# Altium footprint library Connector_Samtec_HLE_SMD.PcbLib: 290 footprints (part 18 of 24)
Each footprint in its own frame and in the unit in brackets; x right, y up, seen from the top. Pads: shape width x height; smd on the part's side, far side on the other; paste and mask are expansions set on the pad; w line width, h text height; cw(c..) or ccw(c..) is an arc to the next point about the centre after c.
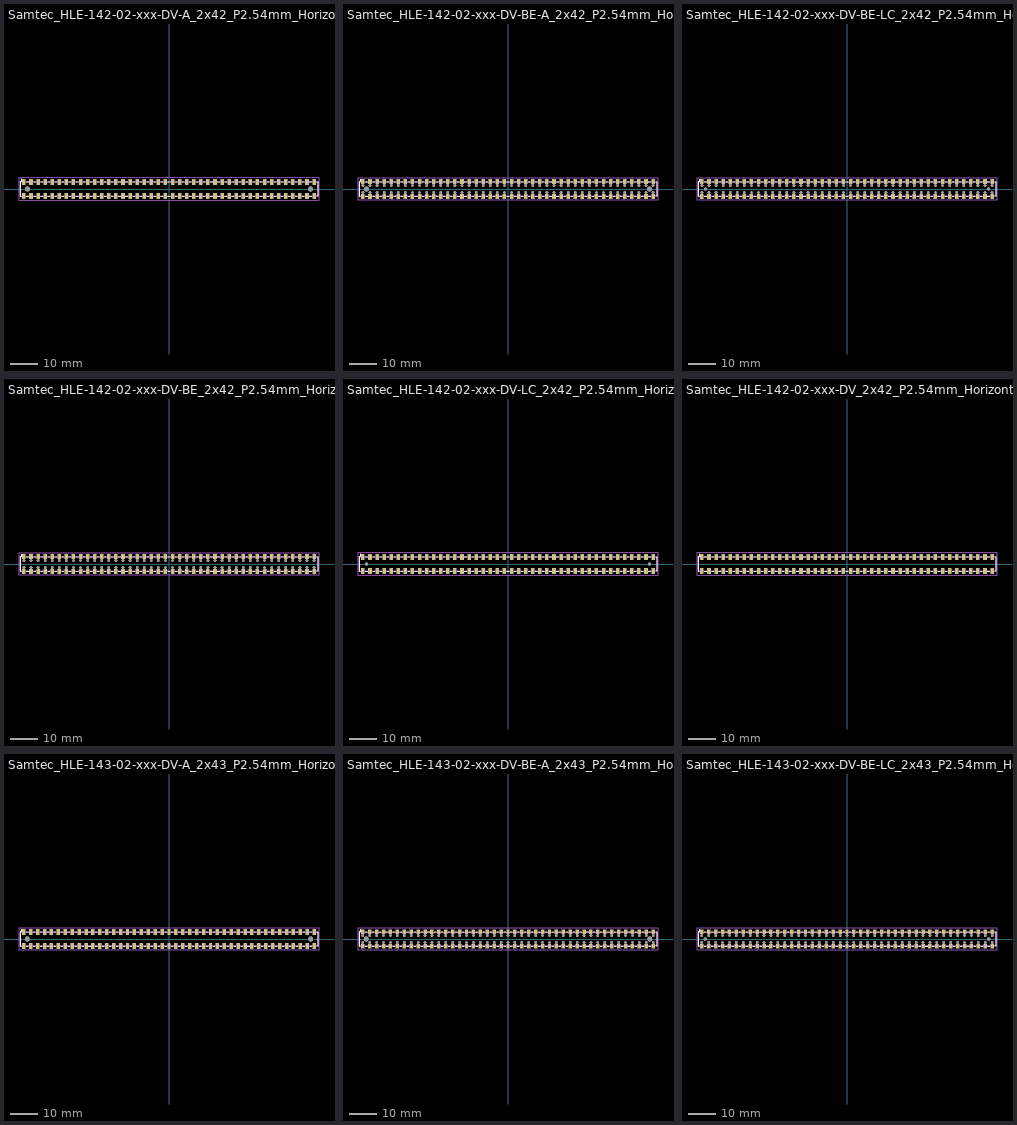
[diagram p17: the footprints below, top view; thin cyan lines are the x and y axes]

## Samtec_HLE-142-02-xxx-DV-A_2x42_P2.54mm_Horizontal [mm]
pads (86):
  rect 1.27x2.29 smd: 1(-52.07,2.525) 2(-52.07,-2.525) 3(-49.53,2.525) 4(-49.53,-2.525) 5(-46.99,2.525) 6(-46.99,-2.525) 7(-44.45,2.525) 8(-44.45,-2.525) 9(-41.91,2.525) 10(-41.91,-2.525) 11(-39.37,2.525) 12(-39.37,-2.525) 13(-36.83,2.525) 14(-36.83,-2.525) 15(-34.29,2.525) 16(-34.29,-2.525) 17(-31.75,2.525) 18(-31.75,-2.525) 19(-29.21,2.525) 20(-29.21,-2.525) 21(-26.67,2.525) 22(-26.67,-2.525) 23(-24.13,2.525) 24(-24.13,-2.525) 25(-21.59,2.525) 26(-21.59,-2.525) 27(-19.05,2.525) 28(-19.05,-2.525) 29(-16.51,2.525) 30(-16.51,-2.525) 31(-13.97,2.525) 32(-13.97,-2.525) 33(-11.43,2.525) 34(-11.43,-2.525) 35(-8.89,2.525) 36(-8.89,-2.525) 37(-6.35,2.525) 38(-6.35,-2.525) 39(-3.81,2.525) 40(-3.81,-2.525) 41(-1.27,2.525) 42(-1.27,-2.525) 43(1.27,2.525) 44(1.27,-2.525) 45(3.81,2.525) 46(3.81,-2.525) 47(6.35,2.525) 48(6.35,-2.525) 49(8.89,2.525) 50(8.89,-2.525) 51(11.43,2.525) 52(11.43,-2.525) 53(13.97,2.525) 54(13.97,-2.525) 55(16.51,2.525) 56(16.51,-2.525) 57(19.05,2.525) 58(19.05,-2.525) 59(21.59,2.525) 60(21.59,-2.525) 61(24.13,2.525) 62(24.13,-2.525) 63(26.67,2.525) 64(26.67,-2.525) 65(29.21,2.525) 66(29.21,-2.525) 67(31.75,2.525) 68(31.75,-2.525) 69(34.29,2.525) 70(34.29,-2.525) 71(36.83,2.525) 72(36.83,-2.525) 73(39.37,2.525) 74(39.37,-2.525) 75(41.91,2.525) 76(41.91,-2.525) 77(44.45,2.525) 78(44.45,-2.525) 79(46.99,2.525) 80(46.99,-2.525) 81(49.53,2.525) 82(49.53,-2.525) 83(52.07,2.525) 84(52.07,-2.525)
  round 1.78 hole 1.78: Un1(-50.8,0) Un2(50.8,0)
F.SilkS:
  lines w0.12: -52.965,-2.65 -53.45,-2.65 -53.45,2.65 -52.965,2.65 -52.965,3.67 ; -51.175,-2.65 -50.425,-2.65 ; -51.175,2.65 -50.425,2.65 ; -48.635,-2.65 -47.885,-2.65 ; -48.635,2.65 -47.885,2.65 ; -46.095,-2.65 -45.345,-2.65 ; -46.095,2.65 -45.345,2.65 ; -43.555,-2.65 -42.805,-2.65 ; -43.555,2.65 -42.805,2.65 ; -41.015,-2.65 -40.265,-2.65 ; -41.015,2.65 -40.265,2.65 ; -38.475,-2.65 -37.725,-2.65 ; -38.475,2.65 -37.725,2.65 ; -35.935,-2.65 -35.185,-2.65 ; -35.935,2.65 -35.185,2.65 ; -33.395,-2.65 -32.645,-2.65 ; -33.395,2.65 -32.645,2.65 ; -30.855,-2.65 -30.105,-2.65 ; -30.855,2.65 -30.105,2.65 ; -28.315,-2.65 -27.565,-2.65 ; -28.315,2.65 -27.565,2.65 ; -25.775,-2.65 -25.025,-2.65 ; -25.775,2.65 -25.025,2.65 ; -23.235,-2.65 -22.485,-2.65 ; -23.235,2.65 -22.485,2.65 ; -20.695,-2.65 -19.945,-2.65 ; -20.695,2.65 -19.945,2.65 ; -18.155,-2.65 -17.405,-2.65 ; -18.155,2.65 -17.405,2.65 ; -15.615,-2.65 -14.865,-2.65 ; -15.615,2.65 -14.865,2.65 ; -13.075,-2.65 -12.325,-2.65 ; -13.075,2.65 -12.325,2.65 ; -10.535,-2.65 -9.785,-2.65 ; -10.535,2.65 -9.785,2.65 ; -7.995,-2.65 -7.245,-2.65 ; -7.995,2.65 -7.245,2.65 ; -5.455,-2.65 -4.705,-2.65 ; -5.455,2.65 -4.705,2.65 ; -2.915,-2.65 -2.165,-2.65 ; -2.915,2.65 -2.165,2.65 ; -0.375,-2.65 0.375,-2.65 ; -0.375,2.65 0.375,2.65 ; 2.165,-2.65 2.915,-2.65 ; 2.165,2.65 2.915,2.65 ; 4.705,-2.65 5.455,-2.65 ; 4.705,2.65 5.455,2.65 ; 7.245,-2.65 7.995,-2.65 ; 7.245,2.65 7.995,2.65 ; 9.785,-2.65 10.535,-2.65 ; 9.785,2.65 10.535,2.65 ; 12.325,-2.65 13.075,-2.65 ; 12.325,2.65 13.075,2.65 ; 14.865,-2.65 15.615,-2.65 ; 14.865,2.65 15.615,2.65 ; 17.405,-2.65 18.155,-2.65 ; 17.405,2.65 18.155,2.65 ; 19.945,-2.65 20.695,-2.65 ; 19.945,2.65 20.695,2.65 ; 22.485,-2.65 23.235,-2.65 ; 22.485,2.65 23.235,2.65 ; 25.025,-2.65 25.775,-2.65 ; 25.025,2.65 25.775,2.65 ; 27.565,-2.65 28.315,-2.65 ; 27.565,2.65 28.315,2.65 ; 30.105,-2.65 30.855,-2.65 ; 30.105,2.65 30.855,2.65 ; 32.645,-2.65 33.395,-2.65 ; 32.645,2.65 33.395,2.65 ; 35.185,-2.65 35.935,-2.65 ; 35.185,2.65 35.935,2.65 ; 37.725,-2.65 38.475,-2.65 ; 37.725,2.65 38.475,2.65 ; 40.265,-2.65 41.015,-2.65 ; 40.265,2.65 41.015,2.65 ; 42.805,-2.65 43.555,-2.65 ; 42.805,2.65 43.555,2.65 ; 45.345,-2.65 46.095,-2.65 ; 45.345,2.65 46.095,2.65 ; 47.885,-2.65 48.635,-2.65 ; 47.885,2.65 48.635,2.65 ; 50.425,-2.65 51.175,-2.65 ; 50.425,2.65 51.175,2.65 ; 52.965,-2.65 53.45,-2.65 53.45,2.65 52.965,2.65
F.CrtYd:
  lines w0.05: -53.84,-4.17 -53.84,4.17 53.84,4.17 53.84,-4.17 -53.84,-4.17
F.Fab:
  lines w0.1: -52.57,2.54 -52.07,1.833 -51.57,2.54 ; -53.34,-2.54 53.34,-2.54 53.34,2.54 -53.34,2.54 -53.34,-2.54
  text "'.Designator'" at -4.047,-2.68 h1

## Samtec_HLE-142-02-xxx-DV-BE-A_2x42_P2.54mm_Horizontal [mm]
pads (170):
  rect 1.27x1.68 smd: 1(-52.07,2.72) 2(-52.07,-2.72) 3(-49.53,2.72) 4(-49.53,-2.72) 5(-46.99,2.72) 6(-46.99,-2.72) 7(-44.45,2.72) 8(-44.45,-2.72) 9(-41.91,2.72) 10(-41.91,-2.72) 11(-39.37,2.72) 12(-39.37,-2.72) 13(-36.83,2.72) 14(-36.83,-2.72) 15(-34.29,2.72) 16(-34.29,-2.72) 17(-31.75,2.72) 18(-31.75,-2.72) 19(-29.21,2.72) 20(-29.21,-2.72) 21(-26.67,2.72) 22(-26.67,-2.72) 23(-24.13,2.72) 24(-24.13,-2.72) 25(-21.59,2.72) 26(-21.59,-2.72) 27(-19.05,2.72) 28(-19.05,-2.72) 29(-16.51,2.72) 30(-16.51,-2.72) 31(-13.97,2.72) 32(-13.97,-2.72) 33(-11.43,2.72) 34(-11.43,-2.72) 35(-8.89,2.72) 36(-8.89,-2.72) 37(-6.35,2.72) 38(-6.35,-2.72) 39(-3.81,2.72) 40(-3.81,-2.72) 41(-1.27,2.72) 42(-1.27,-2.72) 43(1.27,2.72) 44(1.27,-2.72) 45(3.81,2.72) 46(3.81,-2.72) 47(6.35,2.72) 48(6.35,-2.72) 49(8.89,2.72) 50(8.89,-2.72) 51(11.43,2.72) 52(11.43,-2.72) 53(13.97,2.72) 54(13.97,-2.72) 55(16.51,2.72) 56(16.51,-2.72) 57(19.05,2.72) 58(19.05,-2.72) 59(21.59,2.72) 60(21.59,-2.72) 61(24.13,2.72) 62(24.13,-2.72) 63(26.67,2.72) 64(26.67,-2.72) 65(29.21,2.72) 66(29.21,-2.72) 67(31.75,2.72) 68(31.75,-2.72) 69(34.29,2.72) 70(34.29,-2.72) 71(36.83,2.72) 72(36.83,-2.72) 73(39.37,2.72) 74(39.37,-2.72) 75(41.91,2.72) 76(41.91,-2.72) 77(44.45,2.72) 78(44.45,-2.72) 79(46.99,2.72) 80(46.99,-2.72) 81(49.53,2.72) 82(49.53,-2.72) 83(52.07,2.72) 84(52.07,-2.72)
  round 0.97 hole 0.97: Un1(-52.07,-1.27) Un2(36.83,-1.27) Un4(-3.81,1.27) Un5(-3.81,-1.27) Un6(-6.35,-1.27) Un7(36.83,1.27) Un8(29.21,1.27) Un9(-11.43,1.27) Un10(-44.45,-1.27) Un11(13.97,-1.27) Un12(26.67,1.27) Un13(41.91,-1.27) Un14(11.43,-1.27) Un15(-34.29,1.27) Un16(-24.13,-1.27) Un17(-49.53,1.27) Un18(31.75,1.27) Un19(-34.29,-1.27) Un20(-13.97,-1.27) Un21(-41.91,1.27) Un22(21.59,1.27) Un23(39.37,-1.27) Un24(1.27,-1.27) Un25(-31.75,-1.27) Un26(-49.53,-1.27) Un27(-26.67,1.27) Un28(-13.97,1.27) Un29(8.89,-1.27) Un30(-29.21,-1.27) Un31(-24.13,1.27) Un32(44.45,-1.27) Un33(-46.99,-1.27) Un35(44.45,1.27) Un36(6.35,1.27) Un37(34.29,1.27) Un38(-44.45,1.27) Un39(31.75,-1.27) Un40(6.35,-1.27) Un41(46.99,1.27) Un42(8.89,1.27) Un43(24.13,-1.27) Un44(11.43,1.27) Un45(52.07,1.27) Un46(-1.27,1.27) Un47(-39.37,-1.27) Un48(39.37,1.27) Un49(-19.05,-1.27) Un50(-39.37,1.27) Un51(-26.67,-1.27) Un52(-21.59,1.27) Un53(3.81,1.27) Un54(3.81,-1.27) Un55(52.07,-1.27) Un56(41.91,1.27) Un57(-31.75,1.27) Un58(26.67,-1.27) Un59(-46.99,1.27) Un60(46.99,-1.27) Un61(19.05,1.27) Un62(-19.05,1.27) Un63(24.13,1.27) Un64(-1.27,-1.27) Un65(49.53,-1.27) Un66(-6.35,1.27) Un67(-52.07,1.27) Un68(49.53,1.27) Un69(34.29,-1.27) Un70(-11.43,-1.27) Un71(16.51,-1.27) Un72(-8.89,1.27) Un73(-36.83,1.27) Un74(29.21,-1.27) Un75(-36.83,-1.27) Un76(-29.21,1.27) Un77(13.97,1.27) Un78(16.51,1.27) Un79(19.05,-1.27) Un80(-8.89,-1.27) Un81(21.59,-1.27) Un82(-16.51,1.27) Un83(1.27,1.27) Un84(-21.59,-1.27) Un85(-41.91,-1.27) Un86(-16.51,-1.27)
  round 1.78 hole 1.78: Un3(50.8,0) Un34(-50.8,0)
F.SilkS:
  lines w0.12: -52.965,-2.65 -53.45,-2.65 -53.45,2.65 -52.965,2.65 -52.965,3.56 ; -51.175,-2.65 -50.425,-2.65 ; -51.175,2.65 -50.425,2.65 ; -48.635,-2.65 -47.885,-2.65 ; -48.635,2.65 -47.885,2.65 ; -46.095,-2.65 -45.345,-2.65 ; -46.095,2.65 -45.345,2.65 ; -43.555,-2.65 -42.805,-2.65 ; -43.555,2.65 -42.805,2.65 ; -41.015,-2.65 -40.265,-2.65 ; -41.015,2.65 -40.265,2.65 ; -38.475,-2.65 -37.725,-2.65 ; -38.475,2.65 -37.725,2.65 ; -35.935,-2.65 -35.185,-2.65 ; -35.935,2.65 -35.185,2.65 ; -33.395,-2.65 -32.645,-2.65 ; -33.395,2.65 -32.645,2.65 ; -30.855,-2.65 -30.105,-2.65 ; -30.855,2.65 -30.105,2.65 ; -28.315,-2.65 -27.565,-2.65 ; -28.315,2.65 -27.565,2.65 ; -25.775,-2.65 -25.025,-2.65 ; -25.775,2.65 -25.025,2.65 ; -23.235,-2.65 -22.485,-2.65 ; -23.235,2.65 -22.485,2.65 ; -20.695,-2.65 -19.945,-2.65 ; -20.695,2.65 -19.945,2.65 ; -18.155,-2.65 -17.405,-2.65 ; -18.155,2.65 -17.405,2.65 ; -15.615,-2.65 -14.865,-2.65 ; -15.615,2.65 -14.865,2.65 ; -13.075,-2.65 -12.325,-2.65 ; -13.075,2.65 -12.325,2.65 ; -10.535,-2.65 -9.785,-2.65 ; -10.535,2.65 -9.785,2.65 ; -7.995,-2.65 -7.245,-2.65 ; -7.995,2.65 -7.245,2.65 ; -5.455,-2.65 -4.705,-2.65 ; -5.455,2.65 -4.705,2.65 ; -2.915,-2.65 -2.165,-2.65 ; -2.915,2.65 -2.165,2.65 ; -0.375,-2.65 0.375,-2.65 ; -0.375,2.65 0.375,2.65 ; 2.165,-2.65 2.915,-2.65 ; 2.165,2.65 2.915,2.65 ; 4.705,-2.65 5.455,-2.65 ; 4.705,2.65 5.455,2.65 ; 7.245,-2.65 7.995,-2.65 ; 7.245,2.65 7.995,2.65 ; 9.785,-2.65 10.535,-2.65 ; 9.785,2.65 10.535,2.65 ; 12.325,-2.65 13.075,-2.65 ; 12.325,2.65 13.075,2.65 ; 14.865,-2.65 15.615,-2.65 ; 14.865,2.65 15.615,2.65 ; 17.405,-2.65 18.155,-2.65 ; 17.405,2.65 18.155,2.65 ; 19.945,-2.65 20.695,-2.65 ; 19.945,2.65 20.695,2.65 ; 22.485,-2.65 23.235,-2.65 ; 22.485,2.65 23.235,2.65 ; 25.025,-2.65 25.775,-2.65 ; 25.025,2.65 25.775,2.65 ; 27.565,-2.65 28.315,-2.65 ; 27.565,2.65 28.315,2.65 ; 30.105,-2.65 30.855,-2.65 ; 30.105,2.65 30.855,2.65 ; 32.645,-2.65 33.395,-2.65 ; 32.645,2.65 33.395,2.65 ; 35.185,-2.65 35.935,-2.65 ; 35.185,2.65 35.935,2.65 ; 37.725,-2.65 38.475,-2.65 ; 37.725,2.65 38.475,2.65 ; 40.265,-2.65 41.015,-2.65 ; 40.265,2.65 41.015,2.65 ; 42.805,-2.65 43.555,-2.65 ; 42.805,2.65 43.555,2.65 ; 45.345,-2.65 46.095,-2.65 ; 45.345,2.65 46.095,2.65 ; 47.885,-2.65 48.635,-2.65 ; 47.885,2.65 48.635,2.65 ; 50.425,-2.65 51.175,-2.65 ; 50.425,2.65 51.175,2.65 ; 52.965,-2.65 53.45,-2.65 53.45,2.65 52.965,2.65
F.CrtYd:
  lines w0.05: -53.84,-4.06 -53.84,4.06 53.84,4.06 53.84,-4.06 -53.84,-4.06
F.Fab:
  lines w0.1: -52.57,2.54 -52.07,1.833 -51.57,2.54 ; -53.34,-2.54 -53.34,2.54 53.34,2.54 53.34,-2.54 -53.34,-2.54
  text "'.Designator'" at -4.047,-2.68 h1

## Samtec_HLE-142-02-xxx-DV-BE-LC_2x42_P2.54mm_Horizontal [mm]
pads (170):
  rect 1.27x1.68 smd: 1(-52.07,2.72) 2(-52.07,-2.72) 3(-49.53,2.72) 4(-49.53,-2.72) 5(-46.99,2.72) 6(-46.99,-2.72) 7(-44.45,2.72) 8(-44.45,-2.72) 9(-41.91,2.72) 10(-41.91,-2.72) 11(-39.37,2.72) 12(-39.37,-2.72) 13(-36.83,2.72) 14(-36.83,-2.72) 15(-34.29,2.72) 16(-34.29,-2.72) 17(-31.75,2.72) 18(-31.75,-2.72) 19(-29.21,2.72) 20(-29.21,-2.72) 21(-26.67,2.72) 22(-26.67,-2.72) 23(-24.13,2.72) 24(-24.13,-2.72) 25(-21.59,2.72) 26(-21.59,-2.72) 27(-19.05,2.72) 28(-19.05,-2.72) 29(-16.51,2.72) 30(-16.51,-2.72) 31(-13.97,2.72) 32(-13.97,-2.72) 33(-11.43,2.72) 34(-11.43,-2.72) 35(-8.89,2.72) 36(-8.89,-2.72) 37(-6.35,2.72) 38(-6.35,-2.72) 39(-3.81,2.72) 40(-3.81,-2.72) 41(-1.27,2.72) 42(-1.27,-2.72) 43(1.27,2.72) 44(1.27,-2.72) 45(3.81,2.72) 46(3.81,-2.72) 47(6.35,2.72) 48(6.35,-2.72) 49(8.89,2.72) 50(8.89,-2.72) 51(11.43,2.72) 52(11.43,-2.72) 53(13.97,2.72) 54(13.97,-2.72) 55(16.51,2.72) 56(16.51,-2.72) 57(19.05,2.72) 58(19.05,-2.72) 59(21.59,2.72) 60(21.59,-2.72) 61(24.13,2.72) 62(24.13,-2.72) 63(26.67,2.72) 64(26.67,-2.72) 65(29.21,2.72) 66(29.21,-2.72) 67(31.75,2.72) 68(31.75,-2.72) 69(34.29,2.72) 70(34.29,-2.72) 71(36.83,2.72) 72(36.83,-2.72) 73(39.37,2.72) 74(39.37,-2.72) 75(41.91,2.72) 76(41.91,-2.72) 77(44.45,2.72) 78(44.45,-2.72) 79(46.99,2.72) 80(46.99,-2.72) 81(49.53,2.72) 82(49.53,-2.72) 83(52.07,2.72) 84(52.07,-2.72)
  round 0.97 hole 0.97: Un1(13.97,1.27) Un2(11.43,-1.27) Un3(44.45,-1.27) Un4(3.81,1.27) Un5(-24.13,1.27) Un6(8.89,-1.27) Un7(-46.99,1.27) Un8(-8.89,-1.27) Un9(31.75,-1.27) Un10(19.05,-1.27) Un11(3.81,-1.27) Un12(24.13,1.27) Un13(-31.75,-1.27) Un14(31.75,1.27) Un15(-52.07,-1.27) Un16(41.91,-1.27) Un17(34.29,-1.27) Un18(-1.27,-1.27) Un19(46.99,1.27) Un20(52.07,1.27) Un21(-6.35,1.27) Un22(39.37,1.27) Un23(52.07,-1.27) Un24(21.59,-1.27) Un25(46.99,-1.27) Un26(36.83,1.27) Un27(-8.89,1.27) Un28(6.35,1.27) Un29(49.53,1.27) Un30(16.51,-1.27) Un31(19.05,1.27) Un32(49.53,-1.27) Un33(-39.37,1.27) Un34(-26.67,1.27) Un35(-46.99,-1.27) Un36(-3.81,-1.27) Un37(-36.83,-1.27) Un38(-44.45,1.27) Un39(6.35,-1.27) Un40(-1.27,1.27) Un41(13.97,-1.27) Un42(-6.35,-1.27) Un43(-31.75,1.27) Un44(39.37,-1.27) Un45(-11.43,1.27) Un46(36.83,-1.27) Un47(41.91,1.27) Un48(1.27,-1.27) Un49(-41.91,-1.27) Un50(-39.37,-1.27) Un51(-41.91,1.27) Un52(-11.43,-1.27) Un53(34.29,1.27) Un54(-16.51,1.27) Un55(-49.53,-1.27) Un56(-13.97,1.27) Un57(21.59,1.27) Un58(-44.45,-1.27) Un59(-29.21,1.27) Un60(-21.59,1.27) Un62(-24.13,-1.27) Un63(-34.29,-1.27) Un64(8.89,1.27) Un65(-13.97,-1.27) Un66(-19.05,1.27) Un67(-36.83,1.27) Un68(44.45,1.27) Un69(-34.29,1.27) Un70(-26.67,-1.27) Un71(29.21,1.27) Un72(24.13,-1.27) Un73(-19.05,-1.27) Un74(11.43,1.27) Un75(1.27,1.27) Un76(16.51,1.27) Un77(-21.59,-1.27) Un78(-3.81,1.27) Un79(-52.07,1.27) Un80(26.67,-1.27) Un81(26.67,1.27) Un82(-29.21,-1.27) Un83(-49.53,1.27) Un85(-16.51,-1.27) Un86(29.21,-1.27)
  round 1.19 hole 1.19: Un61(50.8,0) Un84(-50.8,0)
F.SilkS:
  lines w0.12: -52.965,-2.65 -53.45,-2.65 -53.45,2.65 -52.965,2.65 -52.965,3.56 ; -51.175,-2.65 -50.425,-2.65 ; -51.175,2.65 -50.425,2.65 ; -48.635,-2.65 -47.885,-2.65 ; -48.635,2.65 -47.885,2.65 ; -46.095,-2.65 -45.345,-2.65 ; -46.095,2.65 -45.345,2.65 ; -43.555,-2.65 -42.805,-2.65 ; -43.555,2.65 -42.805,2.65 ; -41.015,-2.65 -40.265,-2.65 ; -41.015,2.65 -40.265,2.65 ; -38.475,-2.65 -37.725,-2.65 ; -38.475,2.65 -37.725,2.65 ; -35.935,-2.65 -35.185,-2.65 ; -35.935,2.65 -35.185,2.65 ; -33.395,-2.65 -32.645,-2.65 ; -33.395,2.65 -32.645,2.65 ; -30.855,-2.65 -30.105,-2.65 ; -30.855,2.65 -30.105,2.65 ; -28.315,-2.65 -27.565,-2.65 ; -28.315,2.65 -27.565,2.65 ; -25.775,-2.65 -25.025,-2.65 ; -25.775,2.65 -25.025,2.65 ; -23.235,-2.65 -22.485,-2.65 ; -23.235,2.65 -22.485,2.65 ; -20.695,-2.65 -19.945,-2.65 ; -20.695,2.65 -19.945,2.65 ; -18.155,-2.65 -17.405,-2.65 ; -18.155,2.65 -17.405,2.65 ; -15.615,-2.65 -14.865,-2.65 ; -15.615,2.65 -14.865,2.65 ; -13.075,-2.65 -12.325,-2.65 ; -13.075,2.65 -12.325,2.65 ; -10.535,-2.65 -9.785,-2.65 ; -10.535,2.65 -9.785,2.65 ; -7.995,-2.65 -7.245,-2.65 ; -7.995,2.65 -7.245,2.65 ; -5.455,-2.65 -4.705,-2.65 ; -5.455,2.65 -4.705,2.65 ; -2.915,-2.65 -2.165,-2.65 ; -2.915,2.65 -2.165,2.65 ; -0.375,-2.65 0.375,-2.65 ; -0.375,2.65 0.375,2.65 ; 2.165,-2.65 2.915,-2.65 ; 2.165,2.65 2.915,2.65 ; 4.705,-2.65 5.455,-2.65 ; 4.705,2.65 5.455,2.65 ; 7.245,-2.65 7.995,-2.65 ; 7.245,2.65 7.995,2.65 ; 9.785,-2.65 10.535,-2.65 ; 9.785,2.65 10.535,2.65 ; 12.325,-2.65 13.075,-2.65 ; 12.325,2.65 13.075,2.65 ; 14.865,-2.65 15.615,-2.65 ; 14.865,2.65 15.615,2.65 ; 17.405,-2.65 18.155,-2.65 ; 17.405,2.65 18.155,2.65 ; 19.945,-2.65 20.695,-2.65 ; 19.945,2.65 20.695,2.65 ; 22.485,-2.65 23.235,-2.65 ; 22.485,2.65 23.235,2.65 ; 25.025,-2.65 25.775,-2.65 ; 25.025,2.65 25.775,2.65 ; 27.565,-2.65 28.315,-2.65 ; 27.565,2.65 28.315,2.65 ; 30.105,-2.65 30.855,-2.65 ; 30.105,2.65 30.855,2.65 ; 32.645,-2.65 33.395,-2.65 ; 32.645,2.65 33.395,2.65 ; 35.185,-2.65 35.935,-2.65 ; 35.185,2.65 35.935,2.65 ; 37.725,-2.65 38.475,-2.65 ; 37.725,2.65 38.475,2.65 ; 40.265,-2.65 41.015,-2.65 ; 40.265,2.65 41.015,2.65 ; 42.805,-2.65 43.555,-2.65 ; 42.805,2.65 43.555,2.65 ; 45.345,-2.65 46.095,-2.65 ; 45.345,2.65 46.095,2.65 ; 47.885,-2.65 48.635,-2.65 ; 47.885,2.65 48.635,2.65 ; 50.425,-2.65 51.175,-2.65 ; 50.425,2.65 51.175,2.65 ; 52.965,-2.65 53.45,-2.65 53.45,2.65 52.965,2.65
F.CrtYd:
  lines w0.05: -53.84,-4.06 53.84,-4.06 53.84,4.06 -53.84,4.06 -53.84,-4.06
F.Fab:
  lines w0.1: -52.57,2.54 -52.07,1.833 -51.57,2.54 ; -53.34,-2.54 53.34,-2.54 53.34,2.54 -53.34,2.54 -53.34,-2.54
  text "'.Designator'" at -4.047,-2.68 h1

## Samtec_HLE-142-02-xxx-DV-BE_2x42_P2.54mm_Horizontal [mm]
pads (168):
  rect 1.27x1.68 smd: 1(-52.07,2.72) 2(-52.07,-2.72) 3(-49.53,2.72) 4(-49.53,-2.72) 5(-46.99,2.72) 6(-46.99,-2.72) 7(-44.45,2.72) 8(-44.45,-2.72) 9(-41.91,2.72) 10(-41.91,-2.72) 11(-39.37,2.72) 12(-39.37,-2.72) 13(-36.83,2.72) 14(-36.83,-2.72) 15(-34.29,2.72) 16(-34.29,-2.72) 17(-31.75,2.72) 18(-31.75,-2.72) 19(-29.21,2.72) 20(-29.21,-2.72) 21(-26.67,2.72) 22(-26.67,-2.72) 23(-24.13,2.72) 24(-24.13,-2.72) 25(-21.59,2.72) 26(-21.59,-2.72) 27(-19.05,2.72) 28(-19.05,-2.72) 29(-16.51,2.72) 30(-16.51,-2.72) 31(-13.97,2.72) 32(-13.97,-2.72) 33(-11.43,2.72) 34(-11.43,-2.72) 35(-8.89,2.72) 36(-8.89,-2.72) 37(-6.35,2.72) 38(-6.35,-2.72) 39(-3.81,2.72) 40(-3.81,-2.72) 41(-1.27,2.72) 42(-1.27,-2.72) 43(1.27,2.72) 44(1.27,-2.72) 45(3.81,2.72) 46(3.81,-2.72) 47(6.35,2.72) 48(6.35,-2.72) 49(8.89,2.72) 50(8.89,-2.72) 51(11.43,2.72) 52(11.43,-2.72) 53(13.97,2.72) 54(13.97,-2.72) 55(16.51,2.72) 56(16.51,-2.72) 57(19.05,2.72) 58(19.05,-2.72) 59(21.59,2.72) 60(21.59,-2.72) 61(24.13,2.72) 62(24.13,-2.72) 63(26.67,2.72) 64(26.67,-2.72) 65(29.21,2.72) 66(29.21,-2.72) 67(31.75,2.72) 68(31.75,-2.72) 69(34.29,2.72) 70(34.29,-2.72) 71(36.83,2.72) 72(36.83,-2.72) 73(39.37,2.72) 74(39.37,-2.72) 75(41.91,2.72) 76(41.91,-2.72) 77(44.45,2.72) 78(44.45,-2.72) 79(46.99,2.72) 80(46.99,-2.72) 81(49.53,2.72) 82(49.53,-2.72) 83(52.07,2.72) 84(52.07,-2.72)
  round 0.97 hole 0.97: Un1(-46.99,-1.27) Un2(46.99,1.27) Un3(41.91,1.27) Un4(-3.81,-1.27) Un5(21.59,1.27) Un6(-16.51,1.27) Un7(3.81,1.27) Un8(-26.67,-1.27) Un9(21.59,-1.27) Un10(-24.13,-1.27) Un11(13.97,1.27) Un12(29.21,-1.27) Un13(-52.07,1.27) Un14(13.97,-1.27) Un15(-36.83,1.27) Un16(34.29,-1.27) Un17(24.13,-1.27) Un18(-49.53,1.27) Un19(49.53,-1.27) Un20(-41.91,-1.27) Un21(16.51,-1.27) Un22(-41.91,1.27) Un23(52.07,1.27) Un24(34.29,1.27) Un25(-36.83,-1.27) Un26(-46.99,1.27) Un27(-29.21,-1.27) Un28(44.45,1.27) Un29(-3.81,1.27) Un30(39.37,-1.27) Un31(-34.29,1.27) Un32(11.43,-1.27) Un33(-13.97,-1.27) Un34(19.05,1.27) Un35(36.83,1.27) Un36(-19.05,1.27) Un37(36.83,-1.27) Un38(-44.45,1.27) Un39(24.13,1.27) Un40(-21.59,-1.27) Un41(-39.37,-1.27) Un42(-31.75,-1.27) Un43(1.27,1.27) Un44(6.35,-1.27) Un45(1.27,-1.27) Un46(-11.43,1.27) Un47(-1.27,-1.27) Un48(52.07,-1.27) Un49(11.43,1.27) Un50(26.67,-1.27) Un51(49.53,1.27) Un52(8.89,-1.27) Un53(-6.35,1.27) Un54(39.37,1.27) Un55(-24.13,1.27) Un56(41.91,-1.27) Un57(-26.67,1.27) Un58(8.89,1.27) Un59(16.51,1.27) Un60(-6.35,-1.27) Un61(-8.89,-1.27) Un62(46.99,-1.27) Un63(-52.07,-1.27) Un64(44.45,-1.27) Un65(-16.51,-1.27) Un66(31.75,1.27) Un67(-29.21,1.27) Un68(-34.29,-1.27) Un69(-1.27,1.27) Un70(-49.53,-1.27) Un71(3.81,-1.27) Un72(6.35,1.27) Un73(29.21,1.27) Un74(-19.05,-1.27) Un75(31.75,-1.27) Un76(-39.37,1.27) Un77(-13.97,1.27) Un78(-11.43,-1.27) Un79(-31.75,1.27) Un80(-21.59,1.27) Un81(-44.45,-1.27) Un82(19.05,-1.27) Un83(-8.89,1.27) Un84(26.67,1.27)
F.SilkS:
  lines w0.12: -52.965,-2.65 -53.45,-2.65 -53.45,2.65 -52.965,2.65 -52.965,3.56 ; -51.175,-2.65 -50.425,-2.65 ; -51.175,2.65 -50.425,2.65 ; -48.635,-2.65 -47.885,-2.65 ; -48.635,2.65 -47.885,2.65 ; -46.095,-2.65 -45.345,-2.65 ; -46.095,2.65 -45.345,2.65 ; -43.555,-2.65 -42.805,-2.65 ; -43.555,2.65 -42.805,2.65 ; -41.015,-2.65 -40.265,-2.65 ; -41.015,2.65 -40.265,2.65 ; -38.475,-2.65 -37.725,-2.65 ; -38.475,2.65 -37.725,2.65 ; -35.935,-2.65 -35.185,-2.65 ; -35.935,2.65 -35.185,2.65 ; -33.395,-2.65 -32.645,-2.65 ; -33.395,2.65 -32.645,2.65 ; -30.855,-2.65 -30.105,-2.65 ; -30.855,2.65 -30.105,2.65 ; -28.315,-2.65 -27.565,-2.65 ; -28.315,2.65 -27.565,2.65 ; -25.775,-2.65 -25.025,-2.65 ; -25.775,2.65 -25.025,2.65 ; -23.235,-2.65 -22.485,-2.65 ; -23.235,2.65 -22.485,2.65 ; -20.695,-2.65 -19.945,-2.65 ; -20.695,2.65 -19.945,2.65 ; -18.155,-2.65 -17.405,-2.65 ; -18.155,2.65 -17.405,2.65 ; -15.615,-2.65 -14.865,-2.65 ; -15.615,2.65 -14.865,2.65 ; -13.075,-2.65 -12.325,-2.65 ; -13.075,2.65 -12.325,2.65 ; -10.535,-2.65 -9.785,-2.65 ; -10.535,2.65 -9.785,2.65 ; -7.995,-2.65 -7.245,-2.65 ; -7.995,2.65 -7.245,2.65 ; -5.455,-2.65 -4.705,-2.65 ; -5.455,2.65 -4.705,2.65 ; -2.915,-2.65 -2.165,-2.65 ; -2.915,2.65 -2.165,2.65 ; -0.375,-2.65 0.375,-2.65 ; -0.375,2.65 0.375,2.65 ; 2.165,-2.65 2.915,-2.65 ; 2.165,2.65 2.915,2.65 ; 4.705,-2.65 5.455,-2.65 ; 4.705,2.65 5.455,2.65 ; 7.245,-2.65 7.995,-2.65 ; 7.245,2.65 7.995,2.65 ; 9.785,-2.65 10.535,-2.65 ; 9.785,2.65 10.535,2.65 ; 12.325,-2.65 13.075,-2.65 ; 12.325,2.65 13.075,2.65 ; 14.865,-2.65 15.615,-2.65 ; 14.865,2.65 15.615,2.65 ; 17.405,-2.65 18.155,-2.65 ; 17.405,2.65 18.155,2.65 ; 19.945,-2.65 20.695,-2.65 ; 19.945,2.65 20.695,2.65 ; 22.485,-2.65 23.235,-2.65 ; 22.485,2.65 23.235,2.65 ; 25.025,-2.65 25.775,-2.65 ; 25.025,2.65 25.775,2.65 ; 27.565,-2.65 28.315,-2.65 ; 27.565,2.65 28.315,2.65 ; 30.105,-2.65 30.855,-2.65 ; 30.105,2.65 30.855,2.65 ; 32.645,-2.65 33.395,-2.65 ; 32.645,2.65 33.395,2.65 ; 35.185,-2.65 35.935,-2.65 ; 35.185,2.65 35.935,2.65 ; 37.725,-2.65 38.475,-2.65 ; 37.725,2.65 38.475,2.65 ; 40.265,-2.65 41.015,-2.65 ; 40.265,2.65 41.015,2.65 ; 42.805,-2.65 43.555,-2.65 ; 42.805,2.65 43.555,2.65 ; 45.345,-2.65 46.095,-2.65 ; 45.345,2.65 46.095,2.65 ; 47.885,-2.65 48.635,-2.65 ; 47.885,2.65 48.635,2.65 ; 50.425,-2.65 51.175,-2.65 ; 50.425,2.65 51.175,2.65 ; 52.965,-2.65 53.45,-2.65 53.45,2.65 52.965,2.65
F.CrtYd:
  lines w0.05: -53.84,-4.06 -53.84,4.06 53.84,4.06 53.84,-4.06 -53.84,-4.06
F.Fab:
  lines w0.1: -52.57,2.54 -52.07,1.833 -51.57,2.54 ; -53.34,-2.54 -53.34,2.54 53.34,2.54 53.34,-2.54 -53.34,-2.54
  text "'.Designator'" at -4.047,-2.68 h1
